# Altium footprint library MinervaBots.PcbLib: 162 footprints (part 2 of 11)
Each footprint in its own frame and in the unit in brackets; x right, y up, seen from the top. Pads: shape width x height; smd on the part's side, far side on the other; paste and mask are expansions set on the pad; w line width, h text height; cw(c..) or ccw(c..) is an arc to the next point about the centre after c.
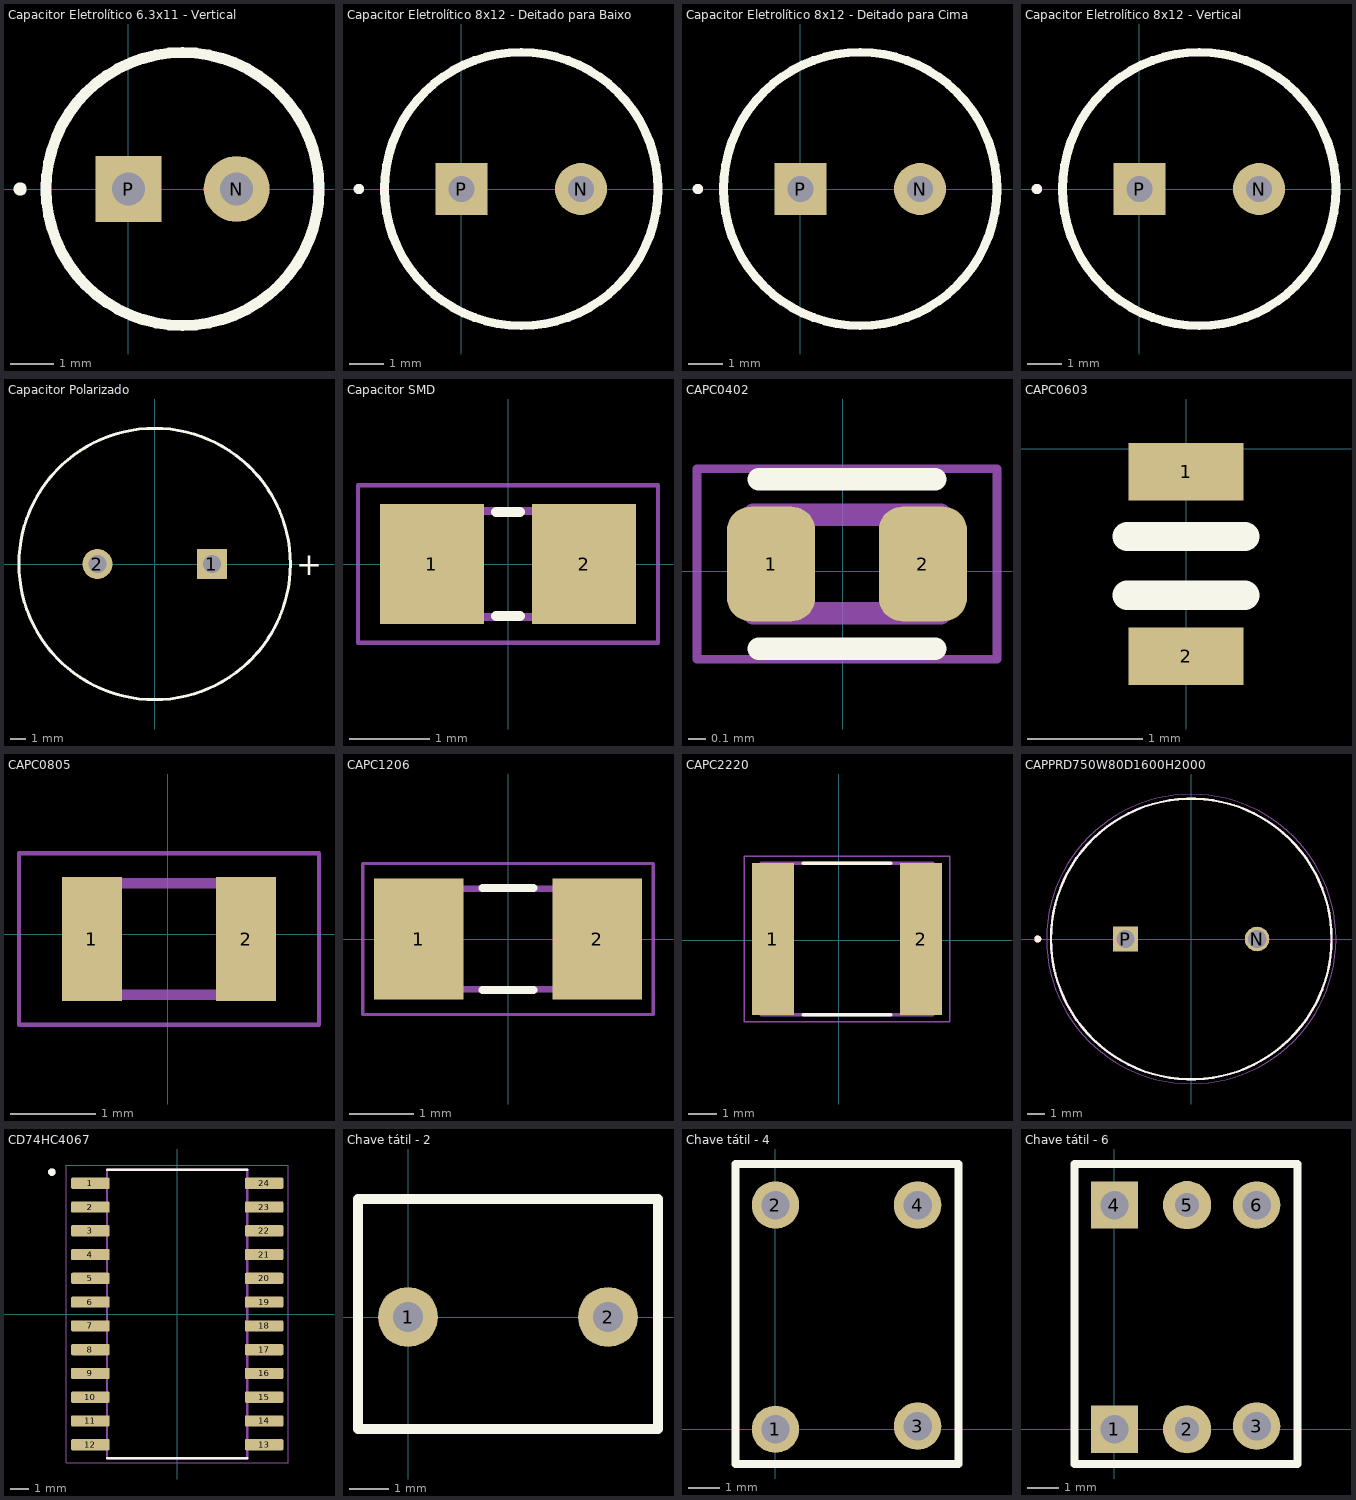
[diagram p1: the footprints below, top view; thin cyan lines are the x and y axes]

## Capacitor Eletrolítico 6.3x11 - Vertical [mil]
pads (2):
  round 60 hole 30: N(98.43,0)
  rect 60x60 hole 30: P(0,0)
Top Overlay:
  circle w10: c-98.43,0 r0.98
  circle w10: c49.21,0 r124.02
Top Designator:
  text ".Designator" at -262.99,-19.99 h60
3D body "ElCapVT-2.5-6.3x11-black.step": height 433.11, standoff -118.11, extent -74.8,-123.92 173.27,123.92

## Capacitor Eletrolítico 8x12 - Deitado para Baixo [mil]
pads (2):
  round 60 hole 30: N(137.8,0)
  rect 60x60 hole 30: P(0,0)
Top Overlay:
  circle w10: c68.9,0 r157.48
  circle w10: c-118.11,0 r0.98
Top Designator:
  text ".Designator" at -246.26,-214.36 h60
3D body "ElCapRA-3.5-8x12-black.step": height 318.85, standoff -118.11, extent -88.58,-551.22 226.42,9.82

## Capacitor Eletrolítico 8x12 - Deitado para Cima [mil]
pads (2):
  round 60 hole 30: N(137.8,0)
  rect 60x60 hole 30: P(0,0)
Top Overlay:
  circle w10: c68.9,0 r157.48
  circle w10: c-118.11,0 r0.98
Top Designator:
  text ".Designator" at -246.26,174.38 h60
3D body "ElCapLA-3.5-8x12-black.step": height 318.85, standoff -118.11, extent -88.58,-9.82 226.42,551.22

## Capacitor Eletrolítico 8x12 - Vertical [mil]
pads (2):
  round 60 hole 30: N(137.8,0)
  rect 60x60 hole 30: P(0,0)
Top Overlay:
  circle w10: c68.9,0 r157.48
  circle w10: c-118.11,0 r0.98
Top Designator:
  text ".Designator" at -246.26,-19.99 h60
3D body "ElCapVT-3.5-8x12-black.step": height 472.48, standoff -118.11, extent -88.58,-157.43 226.42,157.43

## Capacitor Polarizado [mm] "Polarized Capacitor (Radial); 2 Leads"
pads (2):
  rect 2x2 hole 1.2: 1(3.8,0)
  round 2 hole 1.2: 2(-3.8,0)
Top Overlay:
  circle w0.2: c0,0 r9
  text "+" at 9.398,-0.762 h1.5
Top Designator:
  text ".Designator" at -6.894,-0.508 h1.52
3D body "User Library-CapAluRadial_D160H315.STEP": height 33.5, standoff -3, extent -8.25,-8.25 8.25,8.25

## Capacitor SMD [mm]
pads (2):
  rect 1.3x1.5 smd: 1(-0.95,0) 2(0.95,0)
Top Overlay:
  lines w0.127: -0.15,-0.65 0.15,-0.65 ; -0.15,0.65 0.15,0.65
Mechanical 1:
  region: -1.093,0.726 -0.342,0.726 -0.342,-0.724 -1.093,-0.724
  region: 0.356,0.726 1.106,0.726 1.106,-0.724 0.356,-0.724
  lines w0.102: -0.381,0.66 0.381,0.66 ; -0.356,-0.66 0.381,-0.66
Top Designator:
  text ".Designator" at -7.618,-0.508 h1.52
Mechanical 4:
  lines w0.051: -1.873,-0.983 1.873,-0.983 1.873,0.983 -1.873,0.983 -1.873,-0.983
3D body "GCM216R72A153KA37D--3DModel-STEP-56544.STEP": height 0.7, standoff 0, extent -1,-0.625 1,0.625

## CAPC0402 [mm]
pads (2):
  rrect53% 0.5x0.65 smd: 1(-0.407,0.041) 2(0.453,0.041)
Top Overlay:
  lines w0.127: -0.477,-0.439 0.523,-0.439 ; -0.477,0.521 0.523,0.521
Top Designator:
  text ".Designator" at -7.594,-0.467 h1.52
Mechanical 13:
  lines w0.127: -0.507,-0.239 -0.507,0.321 0.553,0.321 0.553,-0.239 -0.507,-0.239
Mechanical 15:
  lines w0.05: -0.827,-0.499 -0.827,0.581 0.873,0.581 0.873,-0.499 -0.827,-0.499
3D body "cap0402.STEP": height 0.55, standoff 0, extent -0.45,-0.225 0.55,0.275

## CAPC0603 [mm]
pads (2):
  rect 1x0.5 smd: 1(0,-0.2) 2(0,-1.8)
Top Overlay:
  lines w0.254: -0.508,-1.27 0.508,-1.27 ; -0.508,-0.762 0.508,-0.762
Top Designator:
  text ".Designator" at -7.618,-1.508 h1.52
3D body "CERAMIC0603.STEP": height 0.8, standoff -0.01, extent -0.45,-1.8 0.45,-0.2

## CAPC0805 [mm]
pads (2):
  rect 0.7x1.45 smd: 1(-0.883,-0.058) 2(0.917,-0.058)
Top Designator:
  text ".Designator" at -7.601,-0.566 h1.52
Mechanical 13:
  lines w0.127: -0.983,-0.708 1.017,-0.708 1.017,0.592 -0.983,0.592 -0.983,-0.708
Mechanical 15:
  lines w0.05: -1.733,-1.058 1.767,-1.058 1.767,0.942 -1.733,0.942 -1.733,-1.058
3D body "0805.2.STEP": height 0.94, standoff 0, extent -1.005,-0.65 1.005,0.6

## CAPC1206 [mm]
pads (2):
  rect 1.4x1.9 smd: 1(-1.4,0) 2(1.4,0)
Top Overlay:
  lines w0.127: -0.4,-0.8 0.4,-0.8 ; -0.4,0.8 0.4,0.8
Top Designator:
  text ".Designator" at -7.618,-0.508 h1.52
Mechanical 13:
  region: 1.702,-0.849 0.952,-0.849 0.952,0.851 1.702,0.851
  region: -0.952,-0.851 -1.702,-0.851 -1.702,0.849 -0.952,0.849
  lines w0.102: -0.965,-0.787 0.965,-0.787 ; -0.965,0.787 0.965,0.787
Mechanical 15:
  lines w0.051: -2.275,-1.183 -2.275,1.183 2.275,1.183 2.275,-1.183 -2.275,-1.183
3D body "CAP1206.STEP": height 1.6, standoff 0, extent -1.6,-0.9 1.6,0.88

## CAPC2220 [mm]
pads (2):
  rect 1.5x5.41 smd: 1(-2.347,0.046) 2(2.931,0.046)
Top Overlay:
  lines w0.127: -1.258,-2.654 1.842,-2.654 ; -1.258,2.746 1.842,2.746
Top Designator:
  text ".Designator" at -7.326,-0.462 h1.52
Mechanical 13:
  lines w0.127: -2.758,-2.654 3.342,-2.654 3.342,2.746 -2.758,2.746 -2.758,-2.654
Mechanical 15:
  lines w0.05: -3.362,-2.904 -3.362,2.996 3.946,2.996 3.946,-2.904 -3.362,-2.904
3D body "cap2220.STEP": height 3.3, standoff 0, extent -2.5,-2.475 3.2,2.525

## CAPPRD750W80D1600H2000 [mm]
pads (2):
  round 1.4 hole 1.05: N(3.75,0)
  rect 1.4x1.4 hole 1.05: P(-3.75,0)
Top Overlay:
  circle w0.2: c-8.75,0 r0.1
  circle w0.127: c0,0 r8
Top Designator:
  text ".Designator" at -7.955,-0.508 h1.52
Mechanical 13:
  circle w0.2: c-8.75,0 r0.1
  circle w0.127: c0,0 r8
Mechanical 15:
  circle w0.05: c0,0 r8.25
3D body "step_temp.STEP": height 20, standoff -17, extent -8,-7.999 8,7.999

## CD74HC4067 [mm]
pads (24):
  rrect25% 2.06x0.6 smd: 1(-4.64,6.985) 2(-4.64,5.715) 3(-4.64,4.445) 4(-4.64,3.175) 5(-4.64,1.905) 6(-4.64,0.635) 7(-4.64,-0.635) 8(-4.64,-1.905) 9(-4.64,-3.175) 10(-4.64,-4.445) 11(-4.64,-5.715) 12(-4.64,-6.985) 13(4.64,-6.985) 14(4.64,-5.715) 15(4.64,-4.445) 16(4.64,-3.175) 17(4.64,-1.905) 18(4.64,-0.635) 19(4.64,0.635) 20(4.64,1.905) 21(4.64,3.175) 22(4.64,4.445) 23(4.64,5.715) 24(4.64,6.985)
Top Overlay:
  circle w0.2: c-6.7,7.585 r0.1
  lines w0.127: -3.75,-7.7 3.75,-7.7 ; -3.75,7.7 3.75,7.7
Top Designator:
  text ".Designator" at -8.095,-0.508 h1.52
Mechanical 13:
  circle w0.2: c-6.7,7.585 r0.1
  lines w0.127: -3.75,-7.7 -3.75,7.7 3.75,7.7 3.75,-7.7 -3.75,-7.7
Mechanical 15:
  lines w0.05: -5.92,-7.95 -5.92,7.95 5.92,7.95 5.92,-7.95 -5.92,-7.95
3D body "CD74HC4067M.STEP": height 2.65, standoff 0, extent -5.15,-7.7 5.15,7.7

## Chave tátil - 2 [mil] "2 pins"
pads (2):
  round 60 hole 30: 1(0,0) 2(200,0)
Top Overlay:
  lines w10: 25,-112 75,-112 ; -50,-112 -50,72 -50,118 250,118 250,-112 -50,-112
Top Designator:
  text ".Designator" at -199.9,-19.49 h60
3D body "ChaveTatil-2pins.stp": height 232.02, standoff -507.33, extent -23.58,-122 220.42,122

## Chave tátil - 4 [mm] "4 pins"
pads (4):
  round 1.5 hole 0.9: 1(0,0) 2(0,7.1) 3(4.5,0.1) 4(4.5,7.1)
Top Overlay:
  lines w0.254: -1.27,-1.1 5.8,-1.1 5.8,8.4 -1.27,8.4 -1.27,3.074 -1.27,-1.1
Top Designator:
  text ".Designator" at -5.353,3.142 h1.52
3D body "ChaveTatil-4pins.step": height 7, standoff -3.5, extent -0.8,-0.35 5.4,7.55

## Chave tátil - 6 [mm] "6 pins"
pads (6):
  rect 1.5x1.5 hole 0.9: 1(0,0) 4(0,7.1)
  round 1.524 hole 0.762: 2(2.3,0) 5(2.3,7.1)
  round 1.5 hole 0.9: 3(4.5,0.1) 6(4.5,7.1)
Top Overlay:
  lines w0.254: -1.27,-1.1 5.8,-1.1 5.8,8.4 -1.27,8.4 -1.27,3.074 -1.27,-1.1
3D body "Botao_Bateria.stp": height 13.6, standoff -3.5, extent -1.7,-0.4 6.3,7.6